# Altium integrated library Altium_WR-BHD (rev21a).IntLib: 216 symbols (part 2 of 2) (continued)
## 62535020621 (continued)
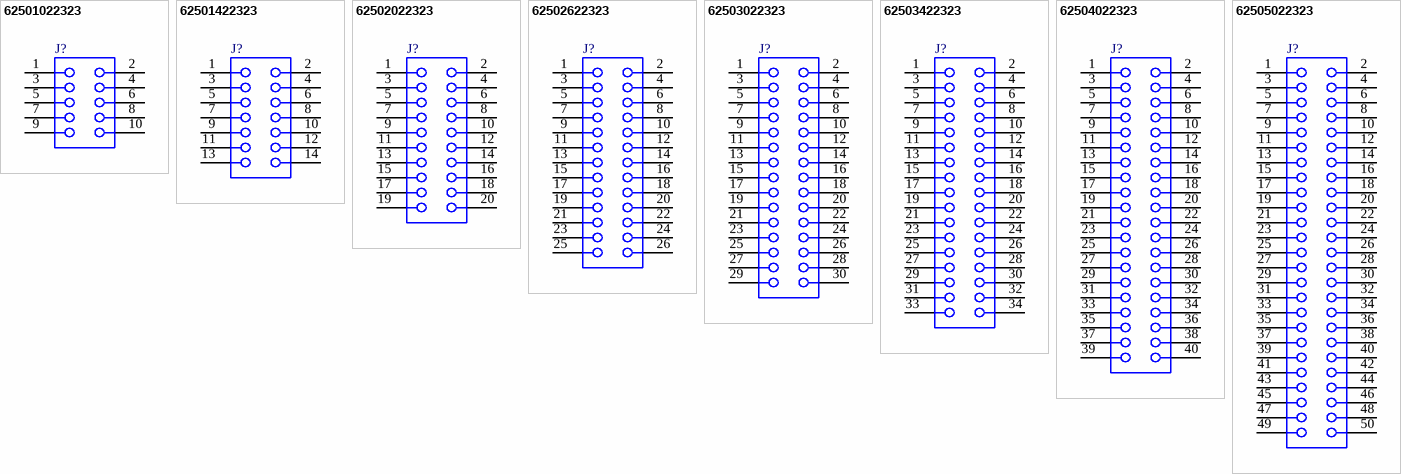
[diagram p6: symbols 62501022323 to 62505022323]

## 62501022323
designator J?
WR-BHD Box Header, Female Cable Side, pitch 2.00mm, THT, Straight, 10p; Manufacturer Part Number: 62501022323; Manufacturer: Wurth Elektronik; Pin Number: 10; Contact Resistance: 20mOhm; Working Voltage: 250VAC; Insulation Resistance: 1000MOhm; Rated Current: 1A; Withstanding Voltage: 500VAC; ComponentLink1Description: Manufacturer; ComponentLink1URL: http://www.we-online.de; ComponentLink2Description: Datasheet; ComponentLink2URL: https://www.we-online.com/catalog/datasheet/62501022323.pdf; Published Date: August 2021; Pitch: 2.00mm; Operating Temperature: -40 to +125degC; Mounting Technology: THT; Packaging: Tray; Gender: Female Cable Side; Length: 14.1mm; Type: Straight
footprint 62501022323
pins: 1, 2, 3, 4, 5, 6, 7, 8, 9, 10

## 62501422323
designator J?
WR-BHD Box Header, Female Cable Side, pitch 2.00mm, THT, Straight, 14p; Manufacturer Part Number: 62501422323; Manufacturer: Wurth Elektronik; Pin Number: 14; Contact Resistance: 20mOhm; Working Voltage: 250VAC; Insulation Resistance: 1000MOhm; Rated Current: 1A; Withstanding Voltage: 500VAC; ComponentLink1Description: Manufacturer; ComponentLink1URL: http://www.we-online.de; ComponentLink2Description: Datasheet; ComponentLink2URL: https://www.we-online.com/catalog/datasheet/62501422323.pdf; Published Date: August 2021; Pitch: 2.00mm; Operating Temperature: -40 to +125degC; Mounting Technology: THT; Packaging: Tray; Gender: Female Cable Side; Length: 18.1mm; Type: Straight
footprint 62501422323
pins: 1, 2, 3, 4, 5, 6, 7, 8, 9, 10, 11, 12, 13, 14

## 62502022323
designator J?
WR-BHD Box Header, Female Cable Side, pitch 2.00mm, THT, Straight, 20p; Manufacturer Part Number: 62502022323; Manufacturer: Wurth Elektronik; Pin Number: 20; Contact Resistance: 20mOhm; Working Voltage: 250VAC; Insulation Resistance: 1000MOhm; Rated Current: 1A; Withstanding Voltage: 500VAC; ComponentLink1Description: Manufacturer; ComponentLink1URL: http://www.we-online.de; ComponentLink2Description: Datasheet; ComponentLink2URL: https://www.we-online.com/catalog/datasheet/62502022323.pdf; Published Date: August 2021; Pitch: 2.00mm; Operating Temperature: -40 to +125degC; Mounting Technology: THT; Packaging: Tray; Gender: Female Cable Side; Length: 24.1mm; Type: Straight
footprint 62502022323
pins: 1, 2, 3, 4, 5, 6, 7, 8, 9, 10, 11, 12, 13, 14, 15, 16, 17, 18, 19, 20

## 62502622323
designator J?
WR-BHD Box Header, Female Cable Side, pitch 2.00mm, THT, Straight, 26p; Manufacturer Part Number: 62502622323; Manufacturer: Wurth Elektronik; Pin Number: 26; Contact Resistance: 20mOhm; Working Voltage: 250VAC; Insulation Resistance: 1000MOhm; Rated Current: 1A; Withstanding Voltage: 500VAC; ComponentLink1Description: Manufacturer; ComponentLink1URL: http://www.we-online.de; ComponentLink2Description: Datasheet; ComponentLink2URL: https://www.we-online.com/catalog/datasheet/62502622323.pdf; Published Date: August 2021; Pitch: 2.00mm; Operating Temperature: -40 to +125degC; Mounting Technology: THT; Packaging: Tray; Gender: Female Cable Side; Length: 30.1mm; Type: Straight
footprint 62502622323
pins: 1, 2, 3, 4, 5, 6, 7, 8, 9, 10, 11, 12, 13, 14, 15, 16, 17, 18, 19, 20, 21, 22, 23, 24, 25, 26

## 62503022323
designator J?
WR-BHD Box Header, Female Cable Side, pitch 2.00mm, THT, Straight, 30p; Manufacturer Part Number: 62503022323; Manufacturer: Wurth Elektronik; Pin Number: 30; Contact Resistance: 20mOhm; Working Voltage: 250VAC; Insulation Resistance: 1000MOhm; Rated Current: 1A; Withstanding Voltage: 500VAC; ComponentLink1Description: Manufacturer; ComponentLink1URL: http://www.we-online.de; ComponentLink2Description: Datasheet; ComponentLink2URL: https://www.we-online.com/catalog/datasheet/62503022323.pdf; Published Date: August 2021; Pitch: 2.00mm; Operating Temperature: -40 to +125degC; Mounting Technology: THT; Packaging: Tray; Gender: Female Cable Side; Length: 34.1mm; Type: Straight
footprint 62503022323
pins: 1, 2, 3, 4, 5, 6, 7, 8, 9, 10, 11, 12, 13, 14, 15, 16, 17, 18, 19, 20, 21, 22, 23, 24, 25, 26, 27, 28, 29, 30

## 62503422323
designator J?
WR-BHD Box Header, Female Cable Side, pitch 2.00mm, THT, Straight, 34p; Manufacturer Part Number: 62503422323; Manufacturer: Wurth Elektronik; Pin Number: 34; Contact Resistance: 20mOhm; Working Voltage: 250VAC; Insulation Resistance: 1000MOhm; Rated Current: 1A; Withstanding Voltage: 500VAC; ComponentLink1Description: Manufacturer; ComponentLink1URL: http://www.we-online.de; ComponentLink2Description: Datasheet; ComponentLink2URL: https://www.we-online.com/catalog/datasheet/62503422323.pdf; Published Date: August 2021; Pitch: 2.00mm; Operating Temperature: -40 to +125degC; Mounting Technology: THT; Packaging: Tray; Gender: Female Cable Side; Length: 38.1mm; Type: Straight
footprint 62503422323
pins: 1, 2, 3, 4, 5, 6, 7, 8, 9, 10, 11, 12, 13, 14, 15, 16, 17, 18, 19, 20, 21, 22, 23, 24, 25, 26, 27, 28, 29, 30, 31, 32, 33, 34

## 62504022323
designator J?
WR-BHD Box Header, Female Cable Side, pitch 2.00mm, THT, Straight, 40p; Manufacturer Part Number: 62504022323; Manufacturer: Wurth Elektronik; Pin Number: 40; Contact Resistance: 20mOhm; Working Voltage: 250VAC; Insulation Resistance: 1000MOhm; Rated Current: 1A; Withstanding Voltage: 500VAC; ComponentLink1Description: Manufacturer; ComponentLink1URL: http://www.we-online.de; ComponentLink2Description: Datasheet; ComponentLink2URL: https://www.we-online.com/catalog/datasheet/62504022323.pdf; Published Date: August 2021; Pitch: 2.00mm; Operating Temperature: -40 to +125degC; Mounting Technology: THT; Packaging: Tray; Gender: Female Cable Side; Length: 44.1mm; Type: Straight
footprint 62504022323
pins: 1, 2, 3, 4, 5, 6, 7, 8, 9, 10, 11, 12, 13, 14, 15, 16, 17, 18, 19, 20, 21, 22, 23, 24, 25, 26, 27, 28, 29, 30, 31, 32, 33, 34, 35, 36, 37, 38, 39, 40

## 62505022323
designator J?
WR-BHD Box Header, Female Cable Side, pitch 2.00mm, THT, Straight, 50p; Manufacturer Part Number: 62505022323; Manufacturer: Wurth Elektronik; Pin Number: 50; Contact Resistance: 20mOhm; Working Voltage: 250VAC; Insulation Resistance: 1000MOhm; Rated Current: 1A; Withstanding Voltage: 500VAC; ComponentLink1Description: Manufacturer; ComponentLink1URL: http://www.we-online.de; ComponentLink2Description: Datasheet; ComponentLink2URL: https://www.we-online.com/catalog/datasheet/62505022323.pdf; Published Date: August 2021; Pitch: 2.00mm; Operating Temperature: -40 to +125degC; Mounting Technology: THT; Packaging: Tray; Gender: Female Cable Side; Length: 54.1mm; Type: Straight
footprint 62505022323
pins: 1, 2, 3, 4, 5, 6, 7, 8, 9, 10, 11, 12, 13, 14, 15, 16, 17, 18, 19, 20, 21, 22, 23, 24, 25, 26, 27, 28, 29, 30, 31, 32, 33, 34, 35, 36, 37, 38, 39, 40, 41, 42, 43, 44, 45, 46, 47, 48, 49, 50


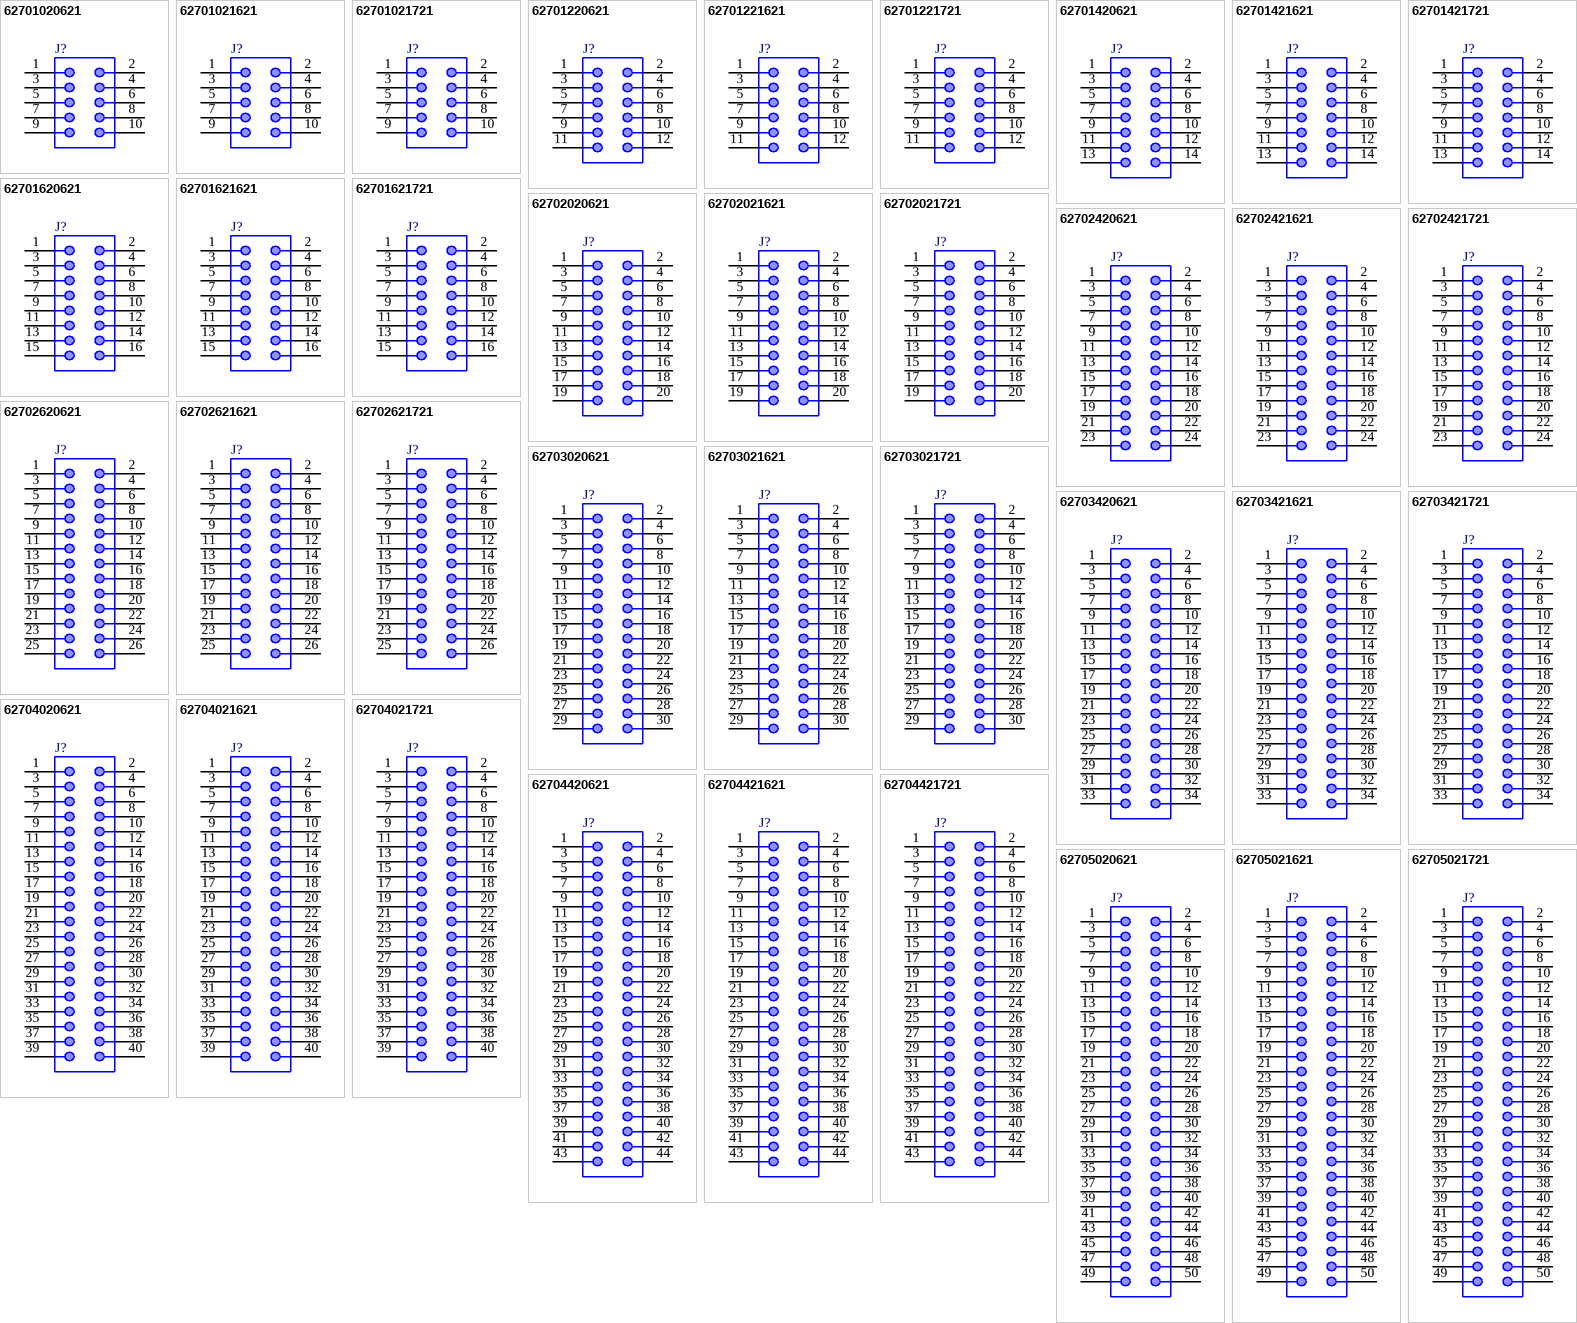
[diagram p7: symbols 62701020621 to 62705021721]

## 62701020621
designator J?
WR-BHD Box Header, Male PCB side, pitch 1.27mm, SMT, Angled, 10p; Manufacturer Part Number: 62701020621; Manufacturer: Wurth Elektronik; Working Voltage: 50VAC; Withstanding Voltage: 500VAC; Contact Resistance: 20mOhm; Pin Number: 10; Insulation Resistance: 1000MOhm; Rated Current: 1A; ComponentLink1Description: Manufacturer; ComponentLink1URL: http://www.we-online.de; ComponentLink2Description: Datasheet; ComponentLink2URL: https://www.we-online.com/catalog/datasheet/62701020621.pdf; Published Date: August 2021; Pitch: 1.27mm; Operating Temperature: -40 to +105degC; Packaging: Tape and Reel; Gender: Male PCB side; Mounting Technology: SMT; Type: Angled; Length: 12.7mm
footprint 62701020621
pins: 1, 2, 3, 4, 5, 6, 7, 8, 9, 10

## 62701021621
designator J?
WR-BHD Box Header, Male PCB side, pitch 1.27mm, THT, Straight, 10p; Manufacturer Part Number: 62701021621; Manufacturer: Wurth Elektronik; Working Voltage: 50VAC; Withstanding Voltage: 500VAC; Contact Resistance: 20mOhm; Pin Number: 10; Insulation Resistance: 1000MOhm; Rated Current: 1A; ComponentLink1Description: Manufacturer; ComponentLink1URL: http://www.we-online.de; ComponentLink2Description: Datasheet; ComponentLink2URL: https://www.we-online.com/catalog/datasheet/62701021621.pdf; Published Date: August 2021; Pitch: 1.27mm; Operating Temperature: -40 to +105degC; Packaging: Tube; Gender: Male PCB side; Mounting Technology: THT; Type: Straight; Length: 12.7mm
footprint 62701021621
pins: 1, 2, 3, 4, 5, 6, 7, 8, 9, 10

## 62701021721
designator J?
WR-BHD Box Header, Male PCB side, pitch 1.27mm, THT, Angled, 10p; Manufacturer Part Number: 62701021721; Manufacturer: Wurth Elektronik; Working Voltage: 50VAC; Withstanding Voltage: 500VAC; Contact Resistance: 20mOhm; Pin Number: 10; Insulation Resistance: 1000MOhm; Rated Current: 1A; ComponentLink1Description: Manufacturer; ComponentLink1URL: http://www.we-online.de; ComponentLink2Description: Datasheet; ComponentLink2URL: https://www.we-online.com/catalog/datasheet/62701021721.pdf; Published Date: August 2021; Pitch: 1.27mm; Operating Temperature: -40 to +105degC; Packaging: Tube; Gender: Male PCB side; Mounting Technology: THT; Type: Angled; Length: 12.7mm
footprint 62701021721
pins: 1, 2, 3, 4, 5, 6, 7, 8, 9, 10

## 62701220621
designator J?
WR-BHD Box Header, Male PCB side, pitch 1.27mm, SMT, Angled, 12p; Manufacturer Part Number: 62701220621; Manufacturer: Wurth Elektronik; Working Voltage: 50VAC; Withstanding Voltage: 500VAC; Contact Resistance: 20mOhm; Pin Number: 12; Insulation Resistance: 1000MOhm; Rated Current: 1A; ComponentLink1Description: Manufacturer; ComponentLink1URL: http://www.we-online.de; ComponentLink2Description: Datasheet; ComponentLink2URL: https://www.we-online.com/catalog/datasheet/62701220621.pdf; Published Date: August 2021; Pitch: 1.27mm; Operating Temperature: -40 to +105degC; Packaging: Tape and Reel; Gender: Male PCB side; Mounting Technology: SMT; Type: Angled; Length: 13.97mm
footprint 62701220621
pins: 1, 2, 3, 4, 5, 6, 7, 8, 9, 10, 11, 12

## 62701221621
designator J?
WR-BHD Box Header, Male PCB side, pitch 1.27mm, THT, Straight, 12p; Manufacturer Part Number: 62701221621; Manufacturer: Wurth Elektronik; Working Voltage: 50VAC; Withstanding Voltage: 500VAC; Contact Resistance: 20mOhm; Pin Number: 12; Insulation Resistance: 1000MOhm; Rated Current: 1A; ComponentLink1Description: Manufacturer; ComponentLink1URL: http://www.we-online.de; ComponentLink2Description: Datasheet; ComponentLink2URL: https://www.we-online.com/catalog/datasheet/62701221621.pdf; Published Date: August 2021; Pitch: 1.27mm; Operating Temperature: -40 to +105degC; Packaging: Tube; Gender: Male PCB side; Mounting Technology: THT; Type: Straight; Length: 13.97mm
footprint 62701221621
pins: 1, 2, 3, 4, 5, 6, 7, 8, 9, 10, 11, 12

## 62701221721
designator J?
WR-BHD Box Header, Male PCB side, pitch 1.27mm, THT, Angled, 12p; Manufacturer Part Number: 62701221721; Manufacturer: Wurth Elektronik; Working Voltage: 50VAC; Withstanding Voltage: 500VAC; Contact Resistance: 20mOhm; Pin Number: 12; Insulation Resistance: 1000MOhm; Rated Current: 1A; ComponentLink1Description: Manufacturer; ComponentLink1URL: http://www.we-online.de; ComponentLink2Description: Datasheet; ComponentLink2URL: https://www.we-online.com/catalog/datasheet/62701221721.pdf; Published Date: August 2021; Pitch: 1.27mm; Operating Temperature: -40 to +105degC; Packaging: Tube; Gender: Male PCB side; Mounting Technology: THT; Type: Angled; Length: 13.97mm
footprint 62701221721
pins: 1, 2, 3, 4, 5, 6, 7, 8, 9, 10, 11, 12

## 62701420621
designator J?
WR-BHD Box Header, Male PCB side, pitch 1.27mm, SMT, Angled, 14p; Manufacturer Part Number: 62701420621; Manufacturer: Wurth Elektronik; Working Voltage: 50VAC; Withstanding Voltage: 500VAC; Contact Resistance: 20mOhm; Pin Number: 14; Insulation Resistance: 1000MOhm; Rated Current: 1A; ComponentLink1Description: Manufacturer; ComponentLink1URL: http://www.we-online.de; ComponentLink2Description: Datasheet; ComponentLink2URL: https://www.we-online.com/catalog/datasheet/62701420621.pdf; Published Date: August 2021; Pitch: 1.27mm; Operating Temperature: -40 to +105degC; Packaging: Tape and Reel; Gender: Male PCB side; Mounting Technology: SMT; Type: Angled; Length: 15.24mm
footprint 62701420621
pins: 1, 2, 3, 4, 5, 6, 7, 8, 9, 10, 11, 12, 13, 14

## 62701421621
designator J?
WR-BHD Box Header, Male PCB side, pitch 1.27mm, THT, Straight, 14p; Manufacturer Part Number: 62701421621; Manufacturer: Wurth Elektronik; Working Voltage: 50VAC; Withstanding Voltage: 500VAC; Contact Resistance: 20mOhm; Pin Number: 14; Insulation Resistance: 1000MOhm; Rated Current: 1A; ComponentLink1Description: Manufacturer; ComponentLink1URL: http://www.we-online.de; ComponentLink2Description: Datasheet; ComponentLink2URL: https://www.we-online.com/catalog/datasheet/62701421621.pdf; Published Date: August 2021; Pitch: 1.27mm; Operating Temperature: -40 to +105degC; Packaging: Tube; Gender: Male PCB side; Mounting Technology: THT; Type: Straight; Length: 15.24mm
footprint 62701421621
pins: 1, 2, 3, 4, 5, 6, 7, 8, 9, 10, 11, 12, 13, 14

## 62701421721
designator J?
WR-BHD Box Header, Male PCB side, pitch 1.27mm, THT, Angled, 14p; Manufacturer Part Number: 62701421721; Manufacturer: Wurth Elektronik; Working Voltage: 50VAC; Withstanding Voltage: 500VAC; Contact Resistance: 20mOhm; Pin Number: 14; Insulation Resistance: 1000MOhm; Rated Current: 1A; ComponentLink1Description: Manufacturer; ComponentLink1URL: http://www.we-online.de; ComponentLink2Description: Datasheet; ComponentLink2URL: https://www.we-online.com/catalog/datasheet/62701421721.pdf; Published Date: August 2021; Pitch: 1.27mm; Operating Temperature: -40 to +105degC; Packaging: Tube; Gender: Male PCB side; Mounting Technology: THT; Type: Angled; Length: 15.24mm
footprint 62701421721
pins: 1, 2, 3, 4, 5, 6, 7, 8, 9, 10, 11, 12, 13, 14

## 62701620621
designator J?
WR-BHD Box Header, Male PCB side, pitch 1.27mm, SMT, Angled, 16p; Manufacturer Part Number: 62701620621; Manufacturer: Wurth Elektronik; Working Voltage: 50VAC; Withstanding Voltage: 500VAC; Contact Resistance: 20mOhm; Pin Number: 16; Insulation Resistance: 1000MOhm; Rated Current: 1A; ComponentLink1Description: Manufacturer; ComponentLink1URL: http://www.we-online.de; ComponentLink2Description: Datasheet; ComponentLink2URL: https://www.we-online.com/catalog/datasheet/62701620621.pdf; Published Date: August 2021; Pitch: 1.27mm; Operating Temperature: -40 to +105degC; Packaging: Tape and Reel; Gender: Male PCB side; Mounting Technology: SMT; Type: Angled; Length: 16.51mm
footprint 62701620621
pins: 1, 2, 3, 4, 5, 6, 7, 8, 9, 10, 11, 12, 13, 14, 15, 16

## 62701621621
designator J?
WR-BHD Box Header, Male PCB side, pitch 1.27mm, THT, Straight, 16p; Manufacturer Part Number: 62701621621; Manufacturer: Wurth Elektronik; Working Voltage: 50VAC; Withstanding Voltage: 500VAC; Contact Resistance: 20mOhm; Pin Number: 16; Insulation Resistance: 1000MOhm; Rated Current: 1A; ComponentLink1Description: Manufacturer; ComponentLink1URL: http://www.we-online.de; ComponentLink2Description: Datasheet; ComponentLink2URL: https://www.we-online.com/catalog/datasheet/62701621621.pdf; Published Date: August 2021; Pitch: 1.27mm; Operating Temperature: -40 to +105degC; Packaging: Tube; Gender: Male PCB side; Mounting Technology: THT; Type: Straight; Length: 16.51mm
footprint 62701621621
pins: 1, 2, 3, 4, 5, 6, 7, 8, 9, 10, 11, 12, 13, 14, 15, 16

## 62701621721
designator J?
WR-BHD Box Header, Male PCB side, pitch 1.27mm, THT, Angled, 16p; Manufacturer Part Number: 62701621721; Manufacturer: Wurth Elektronik; Working Voltage: 50VAC; Withstanding Voltage: 500VAC; Contact Resistance: 20mOhm; Pin Number: 16; Insulation Resistance: 1000MOhm; Rated Current: 1A; ComponentLink1Description: Manufacturer; ComponentLink1URL: http://www.we-online.de; ComponentLink2Description: Datasheet; ComponentLink2URL: https://www.we-online.com/catalog/datasheet/62701621721.pdf; Published Date: August 2021; Pitch: 1.27mm; Operating Temperature: -40 to +105degC; Packaging: Tube; Gender: Male PCB side; Mounting Technology: THT; Type: Angled; Length: 16.51mm
footprint 62701621721
pins: 1, 2, 3, 4, 5, 6, 7, 8, 9, 10, 11, 12, 13, 14, 15, 16

## 62702020621
designator J?
WR-BHD Box Header, Male PCB side, pitch 1.27mm, SMT, Angled, 20p; Manufacturer Part Number: 62702020621; Manufacturer: Wurth Elektronik; Working Voltage: 50VAC; Withstanding Voltage: 500VAC; Contact Resistance: 20mOhm; Pin Number: 20; Insulation Resistance: 1000MOhm; Rated Current: 1A; ComponentLink1Description: Manufacturer; ComponentLink1URL: http://www.we-online.de; ComponentLink2Description: Datasheet; ComponentLink2URL: https://www.we-online.com/catalog/datasheet/62702020621.pdf; Published Date: August 2021; Pitch: 1.27mm; Operating Temperature: -40 to +105degC; Packaging: Tape and Reel; Gender: Male PCB side; Mounting Technology: SMT; Type: Angled; Length: 19.05mm
footprint 62702020621
pins: 1, 2, 3, 4, 5, 6, 7, 8, 9, 10, 11, 12, 13, 14, 15, 16, 17, 18, 19, 20

## 62702021621
designator J?
WR-BHD Box Header, Male PCB side, pitch 1.27mm, THT, Straight, 20p; Manufacturer Part Number: 62702021621; Manufacturer: Wurth Elektronik; Working Voltage: 50VAC; Withstanding Voltage: 500VAC; Contact Resistance: 20mOhm; Pin Number: 20; Insulation Resistance: 1000MOhm; Rated Current: 1A; ComponentLink1Description: Manufacturer; ComponentLink1URL: http://www.we-online.de; ComponentLink2Description: Datasheet; ComponentLink2URL: https://www.we-online.com/catalog/datasheet/62702021621.pdf; Published Date: August 2021; Pitch: 1.27mm; Operating Temperature: -40 to +105degC; Packaging: Tube; Gender: Male PCB side; Mounting Technology: THT; Type: Straight; Length: 19.05mm
footprint 62702021621
pins: 1, 2, 3, 4, 5, 6, 7, 8, 9, 10, 11, 12, 13, 14, 15, 16, 17, 18, 19, 20

## 62702021721
designator J?
WR-BHD Box Header, Male PCB side, pitch 1.27mm, THT, Angled, 20p; Manufacturer Part Number: 62702021721; Manufacturer: Wurth Elektronik; Working Voltage: 50VAC; Withstanding Voltage: 500VAC; Contact Resistance: 20mOhm; Pin Number: 20; Insulation Resistance: 1000MOhm; Rated Current: 1A; ComponentLink1Description: Manufacturer; ComponentLink1URL: http://www.we-online.de; ComponentLink2Description: Datasheet; ComponentLink2URL: https://www.we-online.com/catalog/datasheet/62702021721.pdf; Published Date: August 2021; Pitch: 1.27mm; Operating Temperature: -40 to +105degC; Packaging: Tube; Gender: Male PCB side; Mounting Technology: THT; Type: Angled; Length: 19.05mm
footprint 62702021721
pins: 1, 2, 3, 4, 5, 6, 7, 8, 9, 10, 11, 12, 13, 14, 15, 16, 17, 18, 19, 20

## 62702420621
designator J?
WR-BHD Box Header, Male PCB side, pitch 1.27mm, SMT, Angled, 24p; Manufacturer Part Number: 62702420621; Manufacturer: Wurth Elektronik; Working Voltage: 50VAC; Withstanding Voltage: 500VAC; Contact Resistance: 20mOhm; Pin Number: 24; Insulation Resistance: 1000MOhm; Rated Current: 1A; ComponentLink1Description: Manufacturer; ComponentLink1URL: http://www.we-online.de; ComponentLink2Description: Datasheet; ComponentLink2URL: https://www.we-online.com/catalog/datasheet/62702420621.pdf; Published Date: August 2021; Pitch: 1.27mm; Operating Temperature: -40 to +105degC; Packaging: Tape and Reel; Gender: Male PCB side; Mounting Technology: SMT; Type: Angled; Length: 21.59mm
footprint 62702420621
pins: 1, 2, 3, 4, 5, 6, 7, 8, 9, 10, 11, 12, 13, 14, 15, 16, 17, 18, 19, 20, 21, 22, 23, 24

## 62702421621
designator J?
WR-BHD Box Header, Male PCB side, pitch 1.27mm, THT, Straight, 24p; Manufacturer Part Number: 62702421621; Manufacturer: Wurth Elektronik; Working Voltage: 50VAC; Withstanding Voltage: 500VAC; Contact Resistance: 20mOhm; Pin Number: 24; Insulation Resistance: 1000MOhm; Rated Current: 1A; ComponentLink1Description: Manufacturer; ComponentLink1URL: http://www.we-online.de; ComponentLink2Description: Datasheet; ComponentLink2URL: https://www.we-online.com/catalog/datasheet/62702421621.pdf; Published Date: August 2021; Pitch: 1.27mm; Operating Temperature: -40 to +105degC; Packaging: Tube; Gender: Male PCB side; Mounting Technology: THT; Type: Straight; Length: 21.59mm
footprint 62702421621
pins: 1, 2, 3, 4, 5, 6, 7, 8, 9, 10, 11, 12, 13, 14, 15, 16, 17, 18, 19, 20, 21, 22, 23, 24

## 62702421721
designator J?
WR-BHD Box Header, Male PCB side, pitch 1.27mm, THT, Angled, 24p; Manufacturer Part Number: 62702421721; Manufacturer: Wurth Elektronik; Working Voltage: 50VAC; Withstanding Voltage: 500VAC; Contact Resistance: 20mOhm; Pin Number: 24; Insulation Resistance: 1000MOhm; Rated Current: 1A; ComponentLink1Description: Manufacturer; ComponentLink1URL: http://www.we-online.de; ComponentLink2Description: Datasheet; ComponentLink2URL: https://www.we-online.com/catalog/datasheet/62702421721.pdf; Published Date: August 2021; Pitch: 1.27mm; Operating Temperature: -40 to +105degC; Packaging: Tube; Gender: Male PCB side; Mounting Technology: THT; Type: Angled; Length: 21.59mm
footprint 62702421721
pins: 1, 2, 3, 4, 5, 6, 7, 8, 9, 10, 11, 12, 13, 14, 15, 16, 17, 18, 19, 20, 21, 22, 23, 24

## 62702620621
designator J?
WR-BHD Box Header, Male PCB side, pitch 1.27mm, SMT, Angled, 26p; Manufacturer Part Number: 62702620621; Manufacturer: Wurth Elektronik; Working Voltage: 50VAC; Withstanding Voltage: 500VAC; Contact Resistance: 20mOhm; Pin Number: 26; Insulation Resistance: 1000MOhm; Rated Current: 1A; ComponentLink1Description: Manufacturer; ComponentLink1URL: http://www.we-online.de; ComponentLink2Description: Datasheet; ComponentLink2URL: https://www.we-online.com/catalog/datasheet/62702620621.pdf; Published Date: August 2021; Pitch: 1.27mm; Operating Temperature: -40 to +105degC; Packaging: Tape and Reel; Gender: Male PCB side; Mounting Technology: SMT; Type: Angled; Length: 22.86mm
footprint 62702620621
pins: 1, 2, 3, 4, 5, 6, 7, 8, 9, 10, 11, 12, 13, 14, 15, 16, 17, 18, 19, 20, 21, 22, 23, 24, 25, 26

## 62702621621
designator J?
WR-BHD Box Header, Male PCB side, pitch 1.27mm, THT, Straight, 26p; Manufacturer Part Number: 62702621621; Manufacturer: Wurth Elektronik; Working Voltage: 50VAC; Withstanding Voltage: 500VAC; Contact Resistance: 20mOhm; Pin Number: 26; Insulation Resistance: 1000MOhm; Rated Current: 1A; ComponentLink1Description: Manufacturer; ComponentLink1URL: http://www.we-online.de; ComponentLink2Description: Datasheet; ComponentLink2URL: https://www.we-online.com/catalog/datasheet/62702621621.pdf; Published Date: August 2021; Pitch: 1.27mm; Operating Temperature: -40 to +105degC; Packaging: Tube; Gender: Male PCB side; Mounting Technology: THT; Type: Straight; Length: 22.86mm
footprint 62702621621
pins: 1, 2, 3, 4, 5, 6, 7, 8, 9, 10, 11, 12, 13, 14, 15, 16, 17, 18, 19, 20, 21, 22, 23, 24, 25, 26

## 62702621721
designator J?
WR-BHD Box Header, Male PCB side, pitch 1.27mm, THT, Angled, 26p; Manufacturer Part Number: 62702621721; Manufacturer: Wurth Elektronik; Working Voltage: 50VAC; Withstanding Voltage: 500VAC; Contact Resistance: 20mOhm; Pin Number: 26; Insulation Resistance: 1000MOhm; Rated Current: 1A; ComponentLink1Description: Manufacturer; ComponentLink1URL: http://www.we-online.de; ComponentLink2Description: Datasheet; ComponentLink2URL: https://www.we-online.com/catalog/datasheet/62702621721.pdf; Published Date: August 2021; Pitch: 1.27mm; Operating Temperature: -40 to +105degC; Packaging: Tube; Gender: Male PCB side; Mounting Technology: THT; Type: Angled; Length: 22.86mm
footprint 62702621721
pins: 1, 2, 3, 4, 5, 6, 7, 8, 9, 10, 11, 12, 13, 14, 15, 16, 17, 18, 19, 20, 21, 22, 23, 24, 25, 26

## 62703020621
designator J?
WR-BHD Box Header, Male PCB side, pitch 1.27mm, SMT, Angled, 30p; Manufacturer Part Number: 62703020621; Manufacturer: Wurth Elektronik; Working Voltage: 50VAC; Withstanding Voltage: 500VAC; Contact Resistance: 20mOhm; Pin Number: 30; Insulation Resistance: 1000MOhm; Rated Current: 1A; ComponentLink1Description: Manufacturer; ComponentLink1URL: http://www.we-online.de; ComponentLink2Description: Datasheet; ComponentLink2URL: https://www.we-online.com/catalog/datasheet/62703020621.pdf; Published Date: August 2021; Pitch: 1.27mm; Operating Temperature: -40 to +105degC; Packaging: Tape and Reel; Gender: Male PCB side; Mounting Technology: SMT; Type: Angled; Length: 25.4mm
footprint 62703020621
pins: 1, 2, 3, 4, 5, 6, 7, 8, 9, 10, 11, 12, 13, 14, 15, 16, 17, 18, 19, 20, 21, 22, 23, 24, 25, 26, 27, 28, 29, 30

## 62703021621
designator J?
WR-BHD Box Header, Male PCB side, pitch 1.27mm, THT, Straight, 30p; Manufacturer Part Number: 62703021621; Manufacturer: Wurth Elektronik; Working Voltage: 50VAC; Withstanding Voltage: 500VAC; Contact Resistance: 20mOhm; Pin Number: 30; Insulation Resistance: 1000MOhm; Rated Current: 1A; ComponentLink1Description: Manufacturer; ComponentLink1URL: http://www.we-online.de; ComponentLink2Description: Datasheet; ComponentLink2URL: https://www.we-online.com/catalog/datasheet/62703021621.pdf; Published Date: August 2021; Pitch: 1.27mm; Operating Temperature: -40 to +105degC; Packaging: Tube; Gender: Male PCB side; Mounting Technology: THT; Type: Straight; Length: 25.4mm
footprint 62703021621
pins: 1, 2, 3, 4, 5, 6, 7, 8, 9, 10, 11, 12, 13, 14, 15, 16, 17, 18, 19, 20, 21, 22, 23, 24, 25, 26, 27, 28, 29, 30

## 62703021721
designator J?
WR-BHD Box Header, Male PCB side, pitch 1.27mm, THT, Angled, 30p; Manufacturer Part Number: 62703021721; Manufacturer: Wurth Elektronik; Working Voltage: 50VAC; Withstanding Voltage: 500VAC; Contact Resistance: 20mOhm; Pin Number: 30; Insulation Resistance: 1000MOhm; Rated Current: 1A; ComponentLink1Description: Manufacturer; ComponentLink1URL: http://www.we-online.de; ComponentLink2Description: Datasheet; ComponentLink2URL: https://www.we-online.com/catalog/datasheet/62703021721.pdf; Published Date: August 2021; Pitch: 1.27mm; Operating Temperature: -40 to +105degC; Packaging: Tube; Gender: Male PCB side; Mounting Technology: THT; Type: Angled; Length: 25.4mm
footprint 62703021721
pins: 1, 2, 3, 4, 5, 6, 7, 8, 9, 10, 11, 12, 13, 14, 15, 16, 17, 18, 19, 20, 21, 22, 23, 24, 25, 26, 27, 28, 29, 30

## 62703420621
designator J?
WR-BHD Box Header, Male PCB side, pitch 1.27mm, SMT, Angled, 34p; Manufacturer Part Number: 62703420621; Manufacturer: Wurth Elektronik; Working Voltage: 50VAC; Withstanding Voltage: 500VAC; Contact Resistance: 20mOhm; Pin Number: 34; Insulation Resistance: 1000MOhm; Rated Current: 1A; ComponentLink1Description: Manufacturer; ComponentLink1URL: http://www.we-online.de; ComponentLink2Description: Datasheet; ComponentLink2URL: https://www.we-online.com/catalog/datasheet/62703420621.pdf; Published Date: August 2021; Pitch: 1.27mm; Operating Temperature: -40 to +105degC; Packaging: Tape and Reel; Gender: Male PCB side; Mounting Technology: SMT; Type: Angled; Length: 27.94mm
footprint 62703420621
pins: 1, 2, 3, 4, 5, 6, 7, 8, 9, 10, 11, 12, 13, 14, 15, 16, 17, 18, 19, 20, 21, 22, 23, 24, 25, 26, 27, 28, 29, 30, 31, 32, 33, 34

## 62703421621
designator J?
WR-BHD Box Header, Male PCB side, pitch 1.27mm, THT, Straight, 34p; Manufacturer Part Number: 62703421621; Manufacturer: Wurth Elektronik; Working Voltage: 50VAC; Withstanding Voltage: 500VAC; Contact Resistance: 20mOhm; Pin Number: 34; Insulation Resistance: 1000MOhm; Rated Current: 1A; ComponentLink1Description: Manufacturer; ComponentLink1URL: http://www.we-online.de; ComponentLink2Description: Datasheet; ComponentLink2URL: https://www.we-online.com/catalog/datasheet/62703421621.pdf; Published Date: August 2021; Pitch: 1.27mm; Operating Temperature: -40 to +105degC; Packaging: Tube; Gender: Male PCB side; Mounting Technology: THT; Type: Straight; Length: 27.94mm
footprint 62703421621
pins: 1, 2, 3, 4, 5, 6, 7, 8, 9, 10, 11, 12, 13, 14, 15, 16, 17, 18, 19, 20, 21, 22, 23, 24, 25, 26, 27, 28, 29, 30, 31, 32, 33, 34

## 62703421721
designator J?
WR-BHD Box Header, Male PCB side, pitch 1.27mm, THT, Angled, 34p; Manufacturer Part Number: 62703421721; Manufacturer: Wurth Elektronik; Working Voltage: 50VAC; Withstanding Voltage: 500VAC; Contact Resistance: 20mOhm; Pin Number: 34; Insulation Resistance: 1000MOhm; Rated Current: 1A; ComponentLink1Description: Manufacturer; ComponentLink1URL: http://www.we-online.de; ComponentLink2Description: Datasheet; ComponentLink2URL: https://www.we-online.com/catalog/datasheet/62703421721.pdf; Published Date: August 2021; Pitch: 1.27mm; Operating Temperature: -40 to +105degC; Packaging: Tube; Gender: Male PCB side; Mounting Technology: THT; Type: Angled; Length: 27.94mm
footprint 62703421721
pins: 1, 2, 3, 4, 5, 6, 7, 8, 9, 10, 11, 12, 13, 14, 15, 16, 17, 18, 19, 20, 21, 22, 23, 24, 25, 26, 27, 28, 29, 30, 31, 32, 33, 34

## 62704020621
designator J?
WR-BHD Box Header, Male PCB side, pitch 1.27mm, SMT, Angled, 40p; Manufacturer Part Number: 62704020621; Manufacturer: Wurth Elektronik; Working Voltage: 50VAC; Withstanding Voltage: 500VAC; Contact Resistance: 20mOhm; Pin Number: 40; Insulation Resistance: 1000MOhm; Rated Current: 1A; ComponentLink1Description: Manufacturer; ComponentLink1URL: http://www.we-online.de; ComponentLink2Description: Datasheet; ComponentLink2URL: https://www.we-online.com/catalog/datasheet/62704020621.pdf; Published Date: August 2021; Pitch: 1.27mm; Operating Temperature: -40 to +105degC; Packaging: Tape and Reel; Gender: Male PCB side; Mounting Technology: SMT; Type: Angled; Length: 31.75mm
footprint 62704020621
pins: 1, 2, 3, 4, 5, 6, 7, 8, 9, 10, 11, 12, 13, 14, 15, 16, 17, 18, 19, 20, 21, 22, 23, 24, 25, 26, 27, 28, 29, 30, 31, 32, 33, 34, 35, 36, 37, 38, 39, 40

## 62704021621
designator J?
WR-BHD Box Header, Male PCB side, pitch 1.27mm, THT, Straight, 40p; Manufacturer Part Number: 62704021621; Manufacturer: Wurth Elektronik; Working Voltage: 50VAC; Withstanding Voltage: 500VAC; Contact Resistance: 20mOhm; Pin Number: 40; Insulation Resistance: 1000MOhm; Rated Current: 1A; ComponentLink1Description: Manufacturer; ComponentLink1URL: http://www.we-online.de; ComponentLink2Description: Datasheet; ComponentLink2URL: https://www.we-online.com/catalog/datasheet/62704021621.pdf; Published Date: August 2021; Pitch: 1.27mm; Operating Temperature: -40 to +105degC; Packaging: Tube; Gender: Male PCB side; Mounting Technology: THT; Type: Straight; Length: 31.75mm
footprint 62704021621
pins: 1, 2, 3, 4, 5, 6, 7, 8, 9, 10, 11, 12, 13, 14, 15, 16, 17, 18, 19, 20, 21, 22, 23, 24, 25, 26, 27, 28, 29, 30, 31, 32, 33, 34, 35, 36, 37, 38, 39, 40

## 62704021721
designator J?
WR-BHD Box Header, Male PCB side, pitch 1.27mm, THT, Angled, 40p; Manufacturer Part Number: 62704021721; Manufacturer: Wurth Elektronik; Working Voltage: 50VAC; Withstanding Voltage: 500VAC; Contact Resistance: 20mOhm; Pin Number: 40; Insulation Resistance: 1000MOhm; Rated Current: 1A; ComponentLink1Description: Manufacturer; ComponentLink1URL: http://www.we-online.de; ComponentLink2Description: Datasheet; ComponentLink2URL: https://www.we-online.com/catalog/datasheet/62704021721.pdf; Published Date: August 2021; Pitch: 1.27mm; Operating Temperature: -40 to +105degC; Packaging: Tube; Gender: Male PCB side; Mounting Technology: THT; Type: Angled; Length: 31.75mm
footprint 62704021721
pins: 1, 2, 3, 4, 5, 6, 7, 8, 9, 10, 11, 12, 13, 14, 15, 16, 17, 18, 19, 20, 21, 22, 23, 24, 25, 26, 27, 28, 29, 30, 31, 32, 33, 34, 35, 36, 37, 38, 39, 40

## 62704420621
designator J?
WR-BHD Box Header, Male PCB side, pitch 1.27mm, SMT, Angled, 44p; Manufacturer Part Number: 62704420621; Manufacturer: Wurth Elektronik; Working Voltage: 50VAC; Withstanding Voltage: 500VAC; Contact Resistance: 20mOhm; Pin Number: 44; Insulation Resistance: 1000MOhm; Rated Current: 1A; ComponentLink1Description: Manufacturer; ComponentLink1URL: http://www.we-online.de; ComponentLink2Description: Datasheet; ComponentLink2URL: https://www.we-online.com/catalog/datasheet/62704420621.pdf; Published Date: August 2021; Pitch: 1.27mm; Operating Temperature: -40 to +105degC; Packaging: Tape and Reel; Gender: Male PCB side; Mounting Technology: SMT; Type: Angled; Length: 34.29mm
footprint 62704420621
pins: 1, 2, 3, 4, 5, 6, 7, 8, 9, 10, 11, 12, 13, 14, 15, 16, 17, 18, 19, 20, 21, 22, 23, 24, 25, 26, 27, 28, 29, 30, 31, 32, 33, 34, 35, 36, 37, 38, 39, 40, 41, 42, 43, 44

## 62704421621
designator J?
WR-BHD Box Header, Male PCB side, pitch 1.27mm, THT, Straight, 44p; Manufacturer Part Number: 62704421621; Manufacturer: Wurth Elektronik; Working Voltage: 50VAC; Withstanding Voltage: 500VAC; Contact Resistance: 20mOhm; Pin Number: 44; Insulation Resistance: 1000MOhm; Rated Current: 1A; ComponentLink1Description: Manufacturer; ComponentLink1URL: http://www.we-online.de; ComponentLink2Description: Datasheet; ComponentLink2URL: https://www.we-online.com/catalog/datasheet/62704421621.pdf; Published Date: August 2021; Pitch: 1.27mm; Operating Temperature: -40 to +105degC; Packaging: Tube; Gender: Male PCB side; Mounting Technology: THT; Type: Straight; Length: 34.29mm
footprint 62704421621
pins: 1, 2, 3, 4, 5, 6, 7, 8, 9, 10, 11, 12, 13, 14, 15, 16, 17, 18, 19, 20, 21, 22, 23, 24, 25, 26, 27, 28, 29, 30, 31, 32, 33, 34, 35, 36, 37, 38, 39, 40, 41, 42, 43, 44

## 62704421721
designator J?
WR-BHD Box Header, Male PCB side, pitch 1.27mm, THT, Angled, 44p; Manufacturer Part Number: 62704421721; Manufacturer: Wurth Elektronik; Working Voltage: 50VAC; Withstanding Voltage: 500VAC; Contact Resistance: 20mOhm; Pin Number: 44; Insulation Resistance: 1000MOhm; Rated Current: 1A; ComponentLink1Description: Manufacturer; ComponentLink1URL: http://www.we-online.de; ComponentLink2Description: Datasheet; ComponentLink2URL: https://www.we-online.com/catalog/datasheet/62704421721.pdf; Published Date: August 2021; Pitch: 1.27mm; Operating Temperature: -40 to +105degC; Packaging: Tube; Gender: Male PCB side; Mounting Technology: THT; Type: Angled; Length: 34.29mm
footprint 62704421721
pins: 1, 2, 3, 4, 5, 6, 7, 8, 9, 10, 11, 12, 13, 14, 15, 16, 17, 18, 19, 20, 21, 22, 23, 24, 25, 26, 27, 28, 29, 30, 31, 32, 33, 34, 35, 36, 37, 38, 39, 40, 41, 42, 43, 44

## 62705020621
designator J?
WR-BHD Box Header, Male PCB side, pitch 1.27mm, SMT, Angled, 50p; Manufacturer Part Number: 62705020621; Manufacturer: Wurth Elektronik; Working Voltage: 50VAC; Withstanding Voltage: 500VAC; Contact Resistance: 20mOhm; Pin Number: 50; Insulation Resistance: 1000MOhm; Rated Current: 1A; ComponentLink1Description: Manufacturer; ComponentLink1URL: http://www.we-online.de; ComponentLink2Description: Datasheet; ComponentLink2URL: https://www.we-online.com/catalog/datasheet/62705020621.pdf; Published Date: August 2021; Pitch: 1.27mm; Operating Temperature: -40 to +105degC; Packaging: Tape and Reel; Gender: Male PCB side; Mounting Technology: SMT; Type: Angled; Length: 38.1mm
footprint 62705020621
pins: 1, 2, 3, 4, 5, 6, 7, 8, 9, 10, 11, 12, 13, 14, 15, 16, 17, 18, 19, 20, 21, 22, 23, 24, 25, 26, 27, 28, 29, 30, 31, 32, 33, 34, 35, 36, 37, 38, 39, 40, 41, 42, 43, 44, 45, 46, 47, 48, 49, 50

## 62705021621
designator J?
WR-BHD Box Header, Male PCB side, pitch 1.27mm, THT, Straight, 50p; Manufacturer Part Number: 62705021621; Manufacturer: Wurth Elektronik; Working Voltage: 50VAC; Withstanding Voltage: 500VAC; Contact Resistance: 20mOhm; Pin Number: 50; Insulation Resistance: 1000MOhm; Rated Current: 1A; ComponentLink1Description: Manufacturer; ComponentLink1URL: http://www.we-online.de; ComponentLink2Description: Datasheet; ComponentLink2URL: https://www.we-online.com/catalog/datasheet/62705021621.pdf; Published Date: August 2021; Pitch: 1.27mm; Operating Temperature: -40 to +105degC; Packaging: Tube; Gender: Male PCB side; Mounting Technology: THT; Type: Straight; Length: 38.1mm
footprint 62705021621
pins: 1, 2, 3, 4, 5, 6, 7, 8, 9, 10, 11, 12, 13, 14, 15, 16, 17, 18, 19, 20, 21, 22, 23, 24, 25, 26, 27, 28, 29, 30, 31, 32, 33, 34, 35, 36, 37, 38, 39, 40, 41, 42, 43, 44, 45, 46, 47, 48, 49, 50

## 62705021721
designator J?
WR-BHD Box Header, Male PCB side, pitch 1.27mm, THT, Angled, 50p; Manufacturer Part Number: 62705021721; Manufacturer: Wurth Elektronik; Working Voltage: 50VAC; Withstanding Voltage: 500VAC; Contact Resistance: 20mOhm; Pin Number: 50; Insulation Resistance: 1000MOhm; Rated Current: 1A; ComponentLink1Description: Manufacturer; ComponentLink1URL: http://www.we-online.de; ComponentLink2Description: Datasheet; ComponentLink2URL: https://www.we-online.com/catalog/datasheet/62705021721.pdf; Published Date: August 2021; Pitch: 1.27mm; Operating Temperature: -40 to +105degC; Packaging: Tube; Gender: Male PCB side; Mounting Technology: THT; Type: Angled; Length: 38.1mm
footprint 62705021721
pins: 1, 2, 3, 4, 5, 6, 7, 8, 9, 10, 11, 12, 13, 14, 15, 16, 17, 18, 19, 20, 21, 22, 23, 24, 25, 26, 27, 28, 29, 30, 31, 32, 33, 34, 35, 36, 37, 38, 39, 40, 41, 42, 43, 44, 45, 46, 47, 48, 49, 50

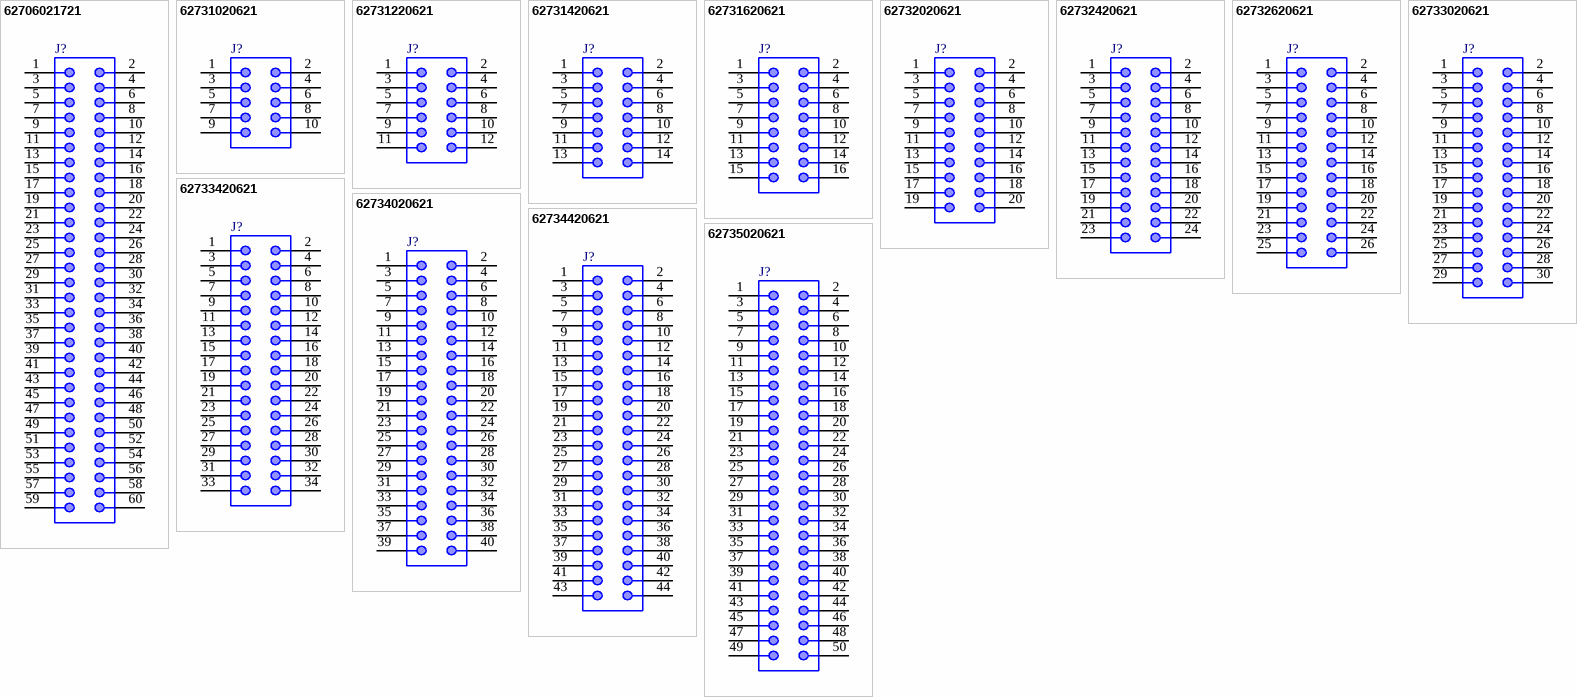
[diagram p8: symbols 62706021721 to 62735020621]

## 62706021721
designator J?
WR-BHD Box Header, Male PCB side, pitch 1.27mm, THT, Angled, 60p; Manufacturer Part Number: 62706021721; Manufacturer: Wurth Elektronik; Working Voltage: 50VAC; Withstanding Voltage: 500VAC; Contact Resistance: 20mOhm; Pin Number: 60; Insulation Resistance: 1000MOhm; Rated Current: 1A; ComponentLink1Description: Manufacturer; ComponentLink1URL: http://www.we-online.de; ComponentLink2Description: Datasheet; ComponentLink2URL: https://www.we-online.com/catalog/datasheet/62706021721.pdf; Published Date: August 2021; Pitch: 1.27mm; Operating Temperature: -40 to +105degC; Packaging: Tube; Gender: Male PCB side; Mounting Technology: THT; Type: Angled; Length: 44.45mm
footprint 62706021721
pins: 1, 2, 3, 4, 5, 6, 7, 8, 9, 10, 11, 12, 13, 14, 15, 16, 17, 18, 19, 20, 21, 22, 23, 24, 25, 26, 27, 28, 29, 30, 31, 32, 33, 34, 35, 36, 37, 38, 39, 40, 41, 42, 43, 44, 45, 46, 47, 48, 49, 50, 51, 52, 53, 54, 55, 56, 57, 58, 59, 60

## 62731020621
designator J?
WR-BHD Box Header, Male PCB side, pitch 1.27mm, SMT, Angled, 10p; Manufacturer Part Number: 62731020621; Manufacturer: Wurth Elektronik; Working Voltage: 50VAC; Withstanding Voltage: 500VAC; Contact Resistance: 20mOhm; Pin Number: 10; Insulation Resistance: 1000MOhm; Rated Current: 1A; ComponentLink1Description: Manufacturer; ComponentLink1URL: http://www.we-online.de; ComponentLink2Description: Datasheet; ComponentLink2URL: https://www.we-online.com/catalog/datasheet/62731020621.pdf; Published Date: August 2021; Pitch: 1.27mm; Operating Temperature: -40 to +105degC; Packaging: Tape and Reel; Gender: Male PCB side; Mounting Technology: SMT; Type: Angled; Length: 12.7mm
footprint 62731020621
pins: 1, 2, 3, 4, 5, 6, 7, 8, 9, 10

## 62731220621
designator J?
WR-BHD Box Header, Male PCB side, pitch 1.27mm, SMT, Angled, 12p; Manufacturer Part Number: 62731220621; Manufacturer: Wurth Elektronik; Working Voltage: 50VAC; Withstanding Voltage: 500VAC; Contact Resistance: 20mOhm; Pin Number: 12; Insulation Resistance: 1000MOhm; Rated Current: 1A; ComponentLink1Description: Manufacturer; ComponentLink1URL: http://www.we-online.de; ComponentLink2Description: Datasheet; ComponentLink2URL: https://www.we-online.com/catalog/datasheet/62731220621.pdf; Published Date: August 2021; Pitch: 1.27mm; Operating Temperature: -40 to +105degC; Packaging: Tape and Reel; Gender: Male PCB side; Mounting Technology: SMT; Type: Angled; Length: 13.97mm
footprint 62731220621
pins: 1, 2, 3, 4, 5, 6, 7, 8, 9, 10, 11, 12

## 62731420621
designator J?
WR-BHD Box Header, Male PCB side, pitch 1.27mm, SMT, Angled, 14p; Manufacturer Part Number: 62731420621; Manufacturer: Wurth Elektronik; Working Voltage: 50VAC; Withstanding Voltage: 500VAC; Contact Resistance: 20mOhm; Pin Number: 14; Insulation Resistance: 1000MOhm; Rated Current: 1A; ComponentLink1Description: Manufacturer; ComponentLink1URL: http://www.we-online.de; ComponentLink2Description: Datasheet; ComponentLink2URL: https://www.we-online.com/catalog/datasheet/62731420621.pdf; Published Date: August 2021; Pitch: 1.27mm; Operating Temperature: -40 to +105degC; Packaging: Tape and Reel; Gender: Male PCB side; Mounting Technology: SMT; Type: Angled; Length: 15.24mm
footprint 62731420621
pins: 1, 2, 3, 4, 5, 6, 7, 8, 9, 10, 11, 12, 13, 14

## 62731620621
designator J?
WR-BHD Box Header, Male PCB side, pitch 1.27mm, SMT, Angled, 16p; Manufacturer Part Number: 62731620621; Manufacturer: Wurth Elektronik; Working Voltage: 50VAC; Withstanding Voltage: 500VAC; Contact Resistance: 20mOhm; Pin Number: 16; Insulation Resistance: 1000MOhm; Rated Current: 1A; ComponentLink1Description: Manufacturer; ComponentLink1URL: http://www.we-online.de; ComponentLink2Description: Datasheet; ComponentLink2URL: https://www.we-online.com/catalog/datasheet/62731620621.pdf; Published Date: August 2021; Pitch: 1.27mm; Operating Temperature: -40 to +105degC; Packaging: Tape and Reel; Gender: Male PCB side; Mounting Technology: SMT; Type: Angled; Length: 16.51mm
footprint 62731620621
pins: 1, 2, 3, 4, 5, 6, 7, 8, 9, 10, 11, 12, 13, 14, 15, 16

## 62732020621
designator J?
WR-BHD Box Header, Male PCB side, pitch 1.27mm, SMT, Angled, 20p; Manufacturer Part Number: 62732020621; Manufacturer: Wurth Elektronik; Working Voltage: 50VAC; Withstanding Voltage: 500VAC; Contact Resistance: 20mOhm; Pin Number: 20; Insulation Resistance: 1000MOhm; Rated Current: 1A; ComponentLink1Description: Manufacturer; ComponentLink1URL: http://www.we-online.de; ComponentLink2Description: Datasheet; ComponentLink2URL: https://www.we-online.com/catalog/datasheet/62732020621.pdf; Published Date: August 2021; Pitch: 1.27mm; Operating Temperature: -40 to +105degC; Packaging: Tape and Reel; Gender: Male PCB side; Mounting Technology: SMT; Type: Angled; Length: 19.05mm
footprint 62732020621
pins: 1, 2, 3, 4, 5, 6, 7, 8, 9, 10, 11, 12, 13, 14, 15, 16, 17, 18, 19, 20

## 62732420621
designator J?
WR-BHD Box Header, Male PCB side, pitch 1.27mm, SMT, Angled, 24p; Manufacturer Part Number: 62732420621; Manufacturer: Wurth Elektronik; Working Voltage: 50VAC; Withstanding Voltage: 500VAC; Contact Resistance: 20mOhm; Pin Number: 24; Insulation Resistance: 1000MOhm; Rated Current: 1A; ComponentLink1Description: Manufacturer; ComponentLink1URL: http://www.we-online.de; ComponentLink2Description: Datasheet; ComponentLink2URL: https://www.we-online.com/catalog/datasheet/62732420621.pdf; Published Date: August 2021; Pitch: 1.27mm; Operating Temperature: -40 to +105degC; Packaging: Tape and Reel; Gender: Male PCB side; Mounting Technology: SMT; Type: Angled; Length: 21.59mm
footprint 62732420621
pins: 1, 2, 3, 4, 5, 6, 7, 8, 9, 10, 11, 12, 13, 14, 15, 16, 17, 18, 19, 20, 21, 22, 23, 24

## 62732620621
designator J?
WR-BHD Box Header, Male PCB side, pitch 1.27mm, SMT, Angled, 26p; Manufacturer Part Number: 62732620621; Manufacturer: Wurth Elektronik; Working Voltage: 50VAC; Withstanding Voltage: 500VAC; Contact Resistance: 20mOhm; Pin Number: 26; Insulation Resistance: 1000MOhm; Rated Current: 1A; ComponentLink1Description: Manufacturer; ComponentLink1URL: http://www.we-online.de; ComponentLink2Description: Datasheet; ComponentLink2URL: https://www.we-online.com/catalog/datasheet/62732620621.pdf; Published Date: August 2021; Pitch: 1.27mm; Operating Temperature: -40 to +105degC; Packaging: Tape and Reel; Gender: Male PCB side; Mounting Technology: SMT; Type: Angled; Length: 22.86mm
footprint 62732620621
pins: 1, 2, 3, 4, 5, 6, 7, 8, 9, 10, 11, 12, 13, 14, 15, 16, 17, 18, 19, 20, 21, 22, 23, 24, 25, 26

## 62733020621
designator J?
WR-BHD Box Header, Male PCB side, pitch 1.27mm, SMT, Angled, 30p; Manufacturer Part Number: 62733020621; Manufacturer: Wurth Elektronik; Working Voltage: 50VAC; Withstanding Voltage: 500VAC; Contact Resistance: 20mOhm; Pin Number: 30; Insulation Resistance: 1000MOhm; Rated Current: 1A; ComponentLink1Description: Manufacturer; ComponentLink1URL: http://www.we-online.de; ComponentLink2Description: Datasheet; ComponentLink2URL: https://www.we-online.com/catalog/datasheet/62733020621.pdf; Published Date: August 2021; Pitch: 1.27mm; Operating Temperature: -40 to +105degC; Packaging: Tape and Reel; Gender: Male PCB side; Mounting Technology: SMT; Type: Angled; Length: 25.4mm
footprint 62733020621
pins: 1, 2, 3, 4, 5, 6, 7, 8, 9, 10, 11, 12, 13, 14, 15, 16, 17, 18, 19, 20, 21, 22, 23, 24, 25, 26, 27, 28, 29, 30

## 62733420621
designator J?
WR-BHD Box Header, Male PCB side, pitch 1.27mm, SMT, Angled, 34p; Manufacturer Part Number: 62733420621; Manufacturer: Wurth Elektronik; Working Voltage: 50VAC; Withstanding Voltage: 500VAC; Contact Resistance: 20mOhm; Pin Number: 34; Insulation Resistance: 1000MOhm; Rated Current: 1A; ComponentLink1Description: Manufacturer; ComponentLink1URL: http://www.we-online.de; ComponentLink2Description: Datasheet; ComponentLink2URL: https://www.we-online.com/catalog/datasheet/62733420621.pdf; Published Date: August 2021; Pitch: 1.27mm; Operating Temperature: -40 to +105degC; Packaging: Tape and Reel; Gender: Male PCB side; Mounting Technology: SMT; Type: Angled; Length: 27.94mm
footprint 62733420621
pins: 1, 2, 3, 4, 5, 6, 7, 8, 9, 10, 11, 12, 13, 14, 15, 16, 17, 18, 19, 20, 21, 22, 23, 24, 25, 26, 27, 28, 29, 30, 31, 32, 33, 34

## 62734020621
designator J?
WR-BHD Box Header, Male PCB side, pitch 1.27mm, SMT, Angled, 40p; Manufacturer Part Number: 62734020621; Manufacturer: Wurth Elektronik; Working Voltage: 50VAC; Withstanding Voltage: 500VAC; Contact Resistance: 20mOhm; Pin Number: 40; Insulation Resistance: 1000MOhm; Rated Current: 1A; ComponentLink1Description: Manufacturer; ComponentLink1URL: http://www.we-online.de; ComponentLink2Description: Datasheet; ComponentLink2URL: https://www.we-online.com/catalog/datasheet/62734020621.pdf; Published Date: August 2021; Pitch: 1.27mm; Operating Temperature: -40 to +105degC; Packaging: Tape and Reel; Gender: Male PCB side; Mounting Technology: SMT; Type: Angled; Length: 31.75mm
footprint 62734020621
pins: 1, 2, 3, 4, 5, 6, 7, 8, 9, 10, 11, 12, 13, 14, 15, 16, 17, 18, 19, 20, 21, 22, 23, 24, 25, 26, 27, 28, 29, 30, 31, 32, 33, 34, 35, 36, 37, 38, 39, 40

## 62734420621
designator J?
WR-BHD Box Header, Male PCB side, pitch 1.27mm, SMT, Angled, 44p; Manufacturer Part Number: 62734420621; Manufacturer: Wurth Elektronik; Working Voltage: 50VAC; Withstanding Voltage: 500VAC; Contact Resistance: 20mOhm; Pin Number: 44; Insulation Resistance: 1000MOhm; Rated Current: 1A; ComponentLink1Description: Manufacturer; ComponentLink1URL: http://www.we-online.de; ComponentLink2Description: Datasheet; ComponentLink2URL: https://www.we-online.com/catalog/datasheet/62734420621.pdf; Published Date: August 2021; Pitch: 1.27mm; Operating Temperature: -40 to +105degC; Packaging: Tape and Reel; Gender: Male PCB side; Mounting Technology: SMT; Type: Angled; Length: 34.29mm
footprint 62734420621
pins: 1, 2, 3, 4, 5, 6, 7, 8, 9, 10, 11, 12, 13, 14, 15, 16, 17, 18, 19, 20, 21, 22, 23, 24, 25, 26, 27, 28, 29, 30, 31, 32, 33, 34, 35, 36, 37, 38, 39, 40, 41, 42, 43, 44

## 62735020621
designator J?
WR-BHD Box Header, Male PCB side, pitch 1.27mm, SMT, Angled, 50p; Manufacturer Part Number: 62735020621; Manufacturer: Wurth Elektronik; Working Voltage: 50VAC; Withstanding Voltage: 500VAC; Contact Resistance: 20mOhm; Pin Number: 50; Insulation Resistance: 1000MOhm; Rated Current: 1A; ComponentLink1Description: Manufacturer; ComponentLink1URL: http://www.we-online.de; ComponentLink2Description: Datasheet; ComponentLink2URL: https://www.we-online.com/catalog/datasheet/62735020621.pdf; Published Date: August 2021; Pitch: 1.27mm; Operating Temperature: -40 to +105degC; Packaging: Tape and Reel; Gender: Male PCB side; Mounting Technology: SMT; Type: Angled; Length: 38.1mm
footprint 62735020621
pins: 1, 2, 3, 4, 5, 6, 7, 8, 9, 10, 11, 12, 13, 14, 15, 16, 17, 18, 19, 20, 21, 22, 23, 24, 25, 26, 27, 28, 29, 30, 31, 32, 33, 34, 35, 36, 37, 38, 39, 40, 41, 42, 43, 44, 45, 46, 47, 48, 49, 50